# Altium footprint library ref-packages.PCBLIB: 1543 footprints (part 80 of 103) (continued)
## SQFP-S-28X28-360 [mm] (continued)
Top Overlay:
  circle w0.254: c-12.25,-12.25 r0.75
  lines w0.203: -13.67,-13.66 13.66,-13.66 13.66,13.66 -13.67,13.66 -13.67,-13.66
Mechanical 16:
  drawing of 364 lines, arcs and shapes, not listed
Mechanical 27:
  lines w0.2: -15.9,-15.9 -15.9,15.9 15.9,15.9 15.9,-15.9 -15.9,-15.9

## SQFP-S-32X32-184 [mm]
pads (184):
  rect 0.4x1.8 smd: 1(-14.625,-17) 2(-13.975,-17) 3(-13.325,-17) 4(-12.675,-17) 5(-12.025,-17) 6(-11.375,-17) 7(-10.725,-17) 8(-10.075,-17) 9(-9.425,-17) 10(-8.775,-17) 11(-8.125,-17) 12(-7.475,-17) 13(-6.825,-17) 14(-6.175,-17) 15(-5.525,-17) 16(-4.875,-17) 17(-4.225,-17) 18(-3.575,-17) 19(-2.925,-17) 20(-2.275,-17) 21(-1.625,-17) 22(-0.975,-17) 23(-0.325,-17) 24(0.325,-17) 25(0.975,-17) 26(1.625,-17) 27(2.275,-17) 28(2.925,-17) 29(3.575,-17) 30(4.225,-17) 31(4.875,-17) 32(5.525,-17) 33(6.175,-17) 34(6.825,-17) 35(7.475,-17) 36(8.125,-17) 37(8.775,-17) 38(9.425,-17) 39(10.075,-17) 40(10.725,-17) 41(11.375,-17) 42(12.025,-17) 43(12.675,-17) 44(13.325,-17) 45(13.975,-17) 46(14.625,-17) 93(14.625,17) 94(13.975,17) 95(13.325,17) 96(12.675,17) 97(12.025,17) 98(11.375,17) 99(10.725,17) 100(10.075,17) 101(9.425,17) 102(8.775,17) 103(8.125,17) 104(7.475,17) 105(6.825,17) 106(6.175,17) 107(5.525,17) 108(4.875,17) 109(4.225,17) 110(3.575,17) 111(2.925,17) 112(2.275,17) 113(1.625,17) 114(0.975,17) 115(0.325,17) 116(-0.325,17) 117(-0.975,17) 118(-1.625,17) 119(-2.275,17) 120(-2.925,17) 121(-3.575,17) 122(-4.225,17) 123(-4.875,17) 124(-5.525,17) 125(-6.175,17) 126(-6.825,17) 127(-7.475,17) 128(-8.125,17) 129(-8.775,17) 130(-9.425,17) 131(-10.075,17) 132(-10.725,17) 133(-11.375,17) 134(-12.025,17) 135(-12.675,17) 136(-13.325,17) 137(-13.975,17) 138(-14.625,17)
  rect 1.8x0.4 smd: 47(17,-14.625) 48(17,-13.975) 49(17,-13.325) 50(17,-12.675) 51(17,-12.025) 52(17,-11.375) 53(17,-10.725) 54(17,-10.075) 55(17,-9.425) 56(17,-8.775) 57(17,-8.125) 58(17,-7.475) 59(17,-6.825) 60(17,-6.175) 61(17,-5.525) 62(17,-4.875) 63(17,-4.225) 64(17,-3.575) 65(17,-2.925) 66(17,-2.275) 67(17,-1.625) 68(17,-0.975) 69(17,-0.325) 70(17,0.325) 71(17,0.975) 72(17,1.625) 73(17,2.275) 74(17,2.925) 75(17,3.575) 76(17,4.225) 77(17,4.875) 78(17,5.525) 79(17,6.175) 80(17,6.825) 81(17,7.475) 82(17,8.125) 83(17,8.775) 84(17,9.425) 85(17,10.075) 86(17,10.725) 87(17,11.375) 88(17,12.025) 89(17,12.675) 90(17,13.325) 91(17,13.975) 92(17,14.625) 139(-17,14.625) 140(-17,13.975) 141(-17,13.325) 142(-17,12.675) 143(-17,12.025) 144(-17,11.375) 145(-17,10.725) 146(-17,10.075) 147(-17,9.425) 148(-17,8.775) 149(-17,8.125) 150(-17,7.475) 151(-17,6.825) 152(-17,6.175) 153(-17,5.525) 154(-17,4.875) 155(-17,4.225) 156(-17,3.575) 157(-17,2.925) 158(-17,2.275) 159(-17,1.625) 160(-17,0.975) 161(-17,0.325) 162(-17,-0.325) 163(-17,-0.975) 164(-17,-1.625) 165(-17,-2.275) 166(-17,-2.925) 167(-17,-3.575) 168(-17,-4.225) 169(-17,-4.875) 170(-17,-5.525) 171(-17,-6.175) 172(-17,-6.825) 173(-17,-7.475) 174(-17,-8.125) 175(-17,-8.775) 176(-17,-9.425) 177(-17,-10.075) 178(-17,-10.725) 179(-17,-11.375) 180(-17,-12.025) 181(-17,-12.675) 182(-17,-13.325) 183(-17,-13.975) 184(-17,-14.625)
Top Overlay:
  circle w0.254: c-14.2,-14.2 r0.75
  lines w0.203: -15.77,-15.76 15.76,-15.76 15.76,15.76 -15.77,15.76 -15.77,-15.76
Mechanical 16:
  drawing of 188 lines, arcs and shapes, not listed
Mechanical 27:
  lines w0.2: -18.4,-18.4 -18.4,18.4 18.4,18.4 18.4,-18.4 -18.4,-18.4

## SQFP-S-32X32-240 [mil]
pads (240):
  rect 11.81x62.99 smd: 1(-580.71,-653.54) 2(-561.02,-653.54) 3(-541.34,-653.54) 4(-521.65,-653.54) 5(-501.97,-653.54) 6(-482.28,-653.54) 7(-462.6,-653.54) 8(-442.91,-653.54) 9(-423.23,-653.54) 10(-403.54,-653.54) 11(-383.86,-653.54) 12(-364.17,-653.54) 13(-344.49,-653.54) 14(-324.8,-653.54) 15(-305.12,-653.54) 16(-285.43,-653.54) 17(-265.75,-653.54) 18(-246.06,-653.54) 19(-226.38,-653.54) 20(-206.69,-653.54) 21(-187.01,-653.54) 22(-167.32,-653.54) 23(-147.64,-653.54) 24(-127.95,-653.54) 25(-108.27,-653.54) 26(-88.58,-653.54) 27(-68.9,-653.54) 28(-49.21,-653.54) 29(-29.53,-653.54) 30(-9.84,-653.54) 31(9.84,-653.54) 32(29.53,-653.54) 33(49.21,-653.54) 34(68.9,-653.54) 35(88.58,-653.54) 36(108.27,-653.54) 37(127.95,-653.54) 38(147.64,-653.54) 39(167.32,-653.54) 40(187.01,-653.54) 41(206.69,-653.54) 42(226.38,-653.54) 43(246.06,-653.54) 44(265.75,-653.54) 45(285.43,-653.54) 46(305.12,-653.54) 47(324.8,-653.54) 48(344.49,-653.54) 49(364.17,-653.54) 50(383.86,-653.54) 51(403.54,-653.54) 52(423.23,-653.54) 53(442.91,-653.54) 54(462.6,-653.54) 55(482.28,-653.54) 56(501.97,-653.54) 57(521.65,-653.54) 58(541.34,-653.54) 59(561.02,-653.54) 60(580.71,-653.54) 121(580.71,653.54) 122(561.02,653.54) 123(541.34,653.54) 124(521.65,653.54) 125(501.97,653.54) 126(482.28,653.54) 127(462.6,653.54) 128(442.91,653.54) 129(423.23,653.54) 130(403.54,653.54) 131(383.86,653.54) 132(364.17,653.54) 133(344.49,653.54) 134(324.8,653.54) 135(305.12,653.54) 136(285.43,653.54) 137(265.75,653.54) 138(246.06,653.54) 139(226.38,653.54) 140(206.69,653.54) 141(187.01,653.54) 142(167.32,653.54) 143(147.64,653.54) 144(127.95,653.54) 145(108.27,653.54) 146(88.58,653.54) 147(68.9,653.54) 148(49.21,653.54) 149(29.53,653.54) 150(9.84,653.54) 151(-9.84,653.54) 152(-29.53,653.54) 153(-49.21,653.54) 154(-68.9,653.54) 155(-88.58,653.54) 156(-108.27,653.54) 157(-127.95,653.54) 158(-147.64,653.54) 159(-167.32,653.54) 160(-187.01,653.54) 161(-206.69,653.54) 162(-226.38,653.54) 163(-246.06,653.54) 164(-265.75,653.54) 165(-285.43,653.54) 166(-305.12,653.54) 167(-324.8,653.54) 168(-344.49,653.54) 169(-364.17,653.54) 170(-383.86,653.54) 171(-403.54,653.54) 172(-423.23,653.54) 173(-442.91,653.54) 174(-462.6,653.54) 175(-482.28,653.54) 176(-501.97,653.54) 177(-521.65,653.54) 178(-541.34,653.54) 179(-561.02,653.54) 180(-580.71,653.54)
  rect 62.99x11.81 smd: 61(653.54,-580.71) 62(653.54,-561.02) 63(653.54,-541.34) 64(653.54,-521.65) 65(653.54,-501.97) 66(653.54,-482.28) 67(653.54,-462.6) 68(653.54,-442.91) 69(653.54,-423.23) 70(653.54,-403.54) 71(653.54,-383.86) 72(653.54,-364.17) 73(653.54,-344.49) 74(653.54,-324.8) 75(653.54,-305.12) 76(653.54,-285.43) 77(653.54,-265.75) 78(653.54,-246.06) 79(653.54,-226.38) 80(653.54,-206.69) 81(653.54,-187.01) 82(653.54,-167.32) 83(653.54,-147.64) 84(653.54,-127.95) 85(653.54,-108.27) 86(653.54,-88.58) 87(653.54,-68.9) 88(653.54,-49.21) 89(653.54,-29.53) 90(653.54,-9.84) 91(653.54,9.84) 92(653.54,29.53) 93(653.54,49.21) 94(653.54,68.9) 95(653.54,88.58) 96(653.54,108.27) 97(653.54,127.95) 98(653.54,147.64) 99(653.54,167.32) 100(653.54,187.01) 101(653.54,206.69) 102(653.54,226.38) 103(653.54,246.06) 104(653.54,265.75) 105(653.54,285.43) 106(653.54,305.12) 107(653.54,324.8) 108(653.54,344.49) 109(653.54,364.17) 110(653.54,383.86) 111(653.54,403.54) 112(653.54,423.23) 113(653.54,442.91) 114(653.54,462.6) 115(653.54,482.28) 116(653.54,501.97) 117(653.54,521.65) 118(653.54,541.34) 119(653.54,561.02) 120(653.54,580.71) 181(-653.54,580.71) 182(-653.54,561.02) 183(-653.54,541.34) 184(-653.54,521.65) 185(-653.54,501.97) 186(-653.54,482.28) 187(-653.54,462.6) 188(-653.54,442.91) 189(-653.54,423.23) 190(-653.54,403.54) 191(-653.54,383.86) 192(-653.54,364.17) 193(-653.54,344.49) 194(-653.54,324.8) 195(-653.54,305.12) 196(-653.54,285.43) 197(-653.54,265.75) 198(-653.54,246.06) 199(-653.54,226.38) 200(-653.54,206.69) 201(-653.54,187.01) 202(-653.54,167.32) 203(-653.54,147.64) 204(-653.54,127.95) 205(-653.54,108.27) 206(-653.54,88.58) 207(-653.54,68.9) 208(-653.54,49.21) 209(-653.54,29.53) 210(-653.54,9.84) 211(-653.54,-9.84) 212(-653.54,-29.53) 213(-653.54,-49.21) 214(-653.54,-68.9) 215(-653.54,-88.58) 216(-653.54,-108.27) 217(-653.54,-127.95) 218(-653.54,-147.64) 219(-653.54,-167.32) 220(-653.54,-187.01) 221(-653.54,-206.69) 222(-653.54,-226.38) 223(-653.54,-246.06) 224(-653.54,-265.75) 225(-653.54,-285.43) 226(-653.54,-305.12) 227(-653.54,-324.8) 228(-653.54,-344.49) 229(-653.54,-364.17) 230(-653.54,-383.86) 231(-653.54,-403.54) 232(-653.54,-423.23) 233(-653.54,-442.91) 234(-653.54,-462.6) 235(-653.54,-482.28) 236(-653.54,-501.97) 237(-653.54,-521.65) 238(-653.54,-541.34) 239(-653.54,-561.02) 240(-653.54,-580.71)
Top Overlay:
  circle w10: c-559.06,-559.06 r29.53
  lines w8: -620.87,-620.47 620.47,-620.47 620.47,620.47 -620.87,620.47 -620.87,-620.47
Mechanical 16:
  drawing of 244 lines, arcs and shapes, not listed
Mechanical 27:
  lines w7.87: -704.72,-704.72 -704.72,704.72 724.41,704.72 724.41,-704.72 -704.72,-704.72

## SQFP-S-32X32-248 [mil]
pads (248):
  rect 11.81x62.99 smd: 1(-600.39,-653.54) 2(-580.71,-653.54) 3(-561.02,-653.54) 4(-541.34,-653.54) 5(-521.65,-653.54) 6(-501.97,-653.54) 7(-482.28,-653.54) 8(-462.6,-653.54) 9(-442.91,-653.54) 10(-423.23,-653.54) 11(-403.54,-653.54) 12(-383.86,-653.54) 13(-364.17,-653.54) 14(-344.49,-653.54) 15(-324.8,-653.54) 16(-305.12,-653.54) 17(-285.43,-653.54) 18(-265.75,-653.54) 19(-246.06,-653.54) 20(-226.38,-653.54) 21(-206.69,-653.54) 22(-187.01,-653.54) 23(-167.32,-653.54) 24(-147.64,-653.54) 25(-127.95,-653.54) 26(-108.27,-653.54) 27(-88.58,-653.54) 28(-68.9,-653.54) 29(-49.21,-653.54) 30(-29.53,-653.54) 31(-9.84,-653.54) 32(9.84,-653.54) 33(29.53,-653.54) 34(49.21,-653.54) 35(68.9,-653.54) 36(88.58,-653.54) 37(108.27,-653.54) 38(127.95,-653.54) 39(147.64,-653.54) 40(167.32,-653.54) 41(187.01,-653.54) 42(206.69,-653.54) 43(226.38,-653.54) 44(246.06,-653.54) 45(265.75,-653.54) 46(285.43,-653.54) 47(305.12,-653.54) 48(324.8,-653.54) 49(344.49,-653.54) 50(364.17,-653.54) 51(383.86,-653.54) 52(403.54,-653.54) 53(423.23,-653.54) 54(442.91,-653.54) 55(462.6,-653.54) 56(482.28,-653.54) 57(501.97,-653.54) 58(521.65,-653.54) 59(541.34,-653.54) 60(561.02,-653.54) 61(580.71,-653.54) 62(600.39,-653.54) 125(600.39,653.54) 126(580.71,653.54) 127(561.02,653.54) 128(541.34,653.54) 129(521.65,653.54) 130(501.97,653.54) 131(482.28,653.54) 132(462.6,653.54) 133(442.91,653.54) 134(423.23,653.54) 135(403.54,653.54) 136(383.86,653.54) 137(364.17,653.54) 138(344.49,653.54) 139(324.8,653.54) 140(305.12,653.54) 141(285.43,653.54) 142(265.75,653.54) 143(246.06,653.54) 144(226.38,653.54) 145(206.69,653.54) 146(187.01,653.54) 147(167.32,653.54) 148(147.64,653.54) 149(127.95,653.54) 150(108.27,653.54) 151(88.58,653.54) 152(68.9,653.54) 153(49.21,653.54) 154(29.53,653.54) 155(9.84,653.54) 156(-9.84,653.54) 157(-29.53,653.54) 158(-49.21,653.54) 159(-68.9,653.54) 160(-88.58,653.54) 161(-108.27,653.54) 162(-127.95,653.54) 163(-147.64,653.54) 164(-167.32,653.54) 165(-187.01,653.54) 166(-206.69,653.54) 167(-226.38,653.54) 168(-246.06,653.54) 169(-265.75,653.54) 170(-285.43,653.54) 171(-305.12,653.54) 172(-324.8,653.54) 173(-344.49,653.54) 174(-364.17,653.54) 175(-383.86,653.54) 176(-403.54,653.54) 177(-423.23,653.54) 178(-442.91,653.54) 179(-462.6,653.54) 180(-482.28,653.54) 181(-501.97,653.54) 182(-521.65,653.54) 183(-541.34,653.54) 184(-561.02,653.54) 185(-580.71,653.54) 186(-600.39,653.54)
  rect 62.99x11.81 smd: 63(653.54,-600.39) 64(653.54,-580.71) 65(653.54,-561.02) 66(653.54,-541.34) 67(653.54,-521.65) 68(653.54,-501.97) 69(653.54,-482.28) 70(653.54,-462.6) 71(653.54,-442.91) 72(653.54,-423.23) 73(653.54,-403.54) 74(653.54,-383.86) 75(653.54,-364.17) 76(653.54,-344.49) 77(653.54,-324.8) 78(653.54,-305.12) 79(653.54,-285.43) 80(653.54,-265.75) 81(653.54,-246.06) 82(653.54,-226.38) 83(653.54,-206.69) 84(653.54,-187.01) 85(653.54,-167.32) 86(653.54,-147.64) 87(653.54,-127.95) 88(653.54,-108.27) 89(653.54,-88.58) 90(653.54,-68.9) 91(653.54,-49.21) 92(653.54,-29.53) 93(653.54,-9.84) 94(653.54,9.84) 95(653.54,29.53) 96(653.54,49.21) 97(653.54,68.9) 98(653.54,88.58) 99(653.54,108.27) 100(653.54,127.95) 101(653.54,147.64) 102(653.54,167.32) 103(653.54,187.01) 104(653.54,206.69) 105(653.54,226.38) 106(653.54,246.06) 107(653.54,265.75) 108(653.54,285.43) 109(653.54,305.12) 110(653.54,324.8) 111(653.54,344.49) 112(653.54,364.17) 113(653.54,383.86) 114(653.54,403.54) 115(653.54,423.23) 116(653.54,442.91) 117(653.54,462.6) 118(653.54,482.28) 119(653.54,501.97) 120(653.54,521.65) 121(653.54,541.34) 122(653.54,561.02) 123(653.54,580.71) 124(653.54,600.39) 187(-653.54,600.39) 188(-653.54,580.71) 189(-653.54,561.02) 190(-653.54,541.34) 191(-653.54,521.65) 192(-653.54,501.97) 193(-653.54,482.28) 194(-653.54,462.6) 195(-653.54,442.91) 196(-653.54,423.23) 197(-653.54,403.54) 198(-653.54,383.86) 199(-653.54,364.17) 200(-653.54,344.49) 201(-653.54,324.8) 202(-653.54,305.12) 203(-653.54,285.43) 204(-653.54,265.75) 205(-653.54,246.06) 206(-653.54,226.38) 207(-653.54,206.69) 208(-653.54,187.01) 209(-653.54,167.32) 210(-653.54,147.64) 211(-653.54,127.95) 212(-653.54,108.27) 213(-653.54,88.58) 214(-653.54,68.9) 215(-653.54,49.21) 216(-653.54,29.53) 217(-653.54,9.84) 218(-653.54,-9.84) 219(-653.54,-29.53) 220(-653.54,-49.21) 221(-653.54,-68.9) 222(-653.54,-88.58) 223(-653.54,-108.27) 224(-653.54,-127.95) 225(-653.54,-147.64) 226(-653.54,-167.32) 227(-653.54,-187.01) 228(-653.54,-206.69) 229(-653.54,-226.38) 230(-653.54,-246.06) 231(-653.54,-265.75) 232(-653.54,-285.43) 233(-653.54,-305.12) 234(-653.54,-324.8) 235(-653.54,-344.49) 236(-653.54,-364.17) 237(-653.54,-383.86) 238(-653.54,-403.54) 239(-653.54,-423.23) 240(-653.54,-442.91) 241(-653.54,-462.6) 242(-653.54,-482.28) 243(-653.54,-501.97) 244(-653.54,-521.65) 245(-653.54,-541.34) 246(-653.54,-561.02) 247(-653.54,-580.71) 248(-653.54,-600.39)
Top Overlay:
  circle w10: c-559.06,-559.06 r29.53
  lines w8: -620.87,-620.47 620.47,-620.47 620.47,620.47 -620.87,620.47 -620.87,-620.47
Mechanical 16:
  drawing of 252 lines, arcs and shapes, not listed
Mechanical 27:
  lines w7.87: -704.72,-704.72 -704.72,704.72 724.41,704.72 724.41,-704.72 -704.72,-704.72

## SQFP-S-32X32-304 [mm]
pads (304):
  rect 0.25x1.6 smd: 1(-15,-16.6) 2(-14.6,-16.6) 3(-14.2,-16.6) 4(-13.8,-16.6) 5(-13.4,-16.6) 6(-13,-16.6) 7(-12.6,-16.6) 8(-12.2,-16.6) 9(-11.8,-16.6) 10(-11.4,-16.6) 11(-11,-16.6) 12(-10.6,-16.6) 13(-10.2,-16.6) 14(-9.8,-16.6) 15(-9.4,-16.6) 16(-9,-16.6) 17(-8.6,-16.6) 18(-8.2,-16.6) 19(-7.8,-16.6) 20(-7.4,-16.6) 21(-7,-16.6) 22(-6.6,-16.6) 23(-6.2,-16.6) 24(-5.8,-16.6) 25(-5.4,-16.6) 26(-5,-16.6) 27(-4.6,-16.6) 28(-4.2,-16.6) 29(-3.8,-16.6) 30(-3.4,-16.6) 31(-3,-16.6) 32(-2.6,-16.6) 33(-2.2,-16.6) 34(-1.8,-16.6) 35(-1.4,-16.6) 36(-1,-16.6) 37(-0.6,-16.6) 38(-0.2,-16.6) 39(0.2,-16.6) 40(0.6,-16.6) 41(1,-16.6) 42(1.4,-16.6) 43(1.8,-16.6) 44(2.2,-16.6) 45(2.6,-16.6) 46(3,-16.6) 47(3.4,-16.6) 48(3.8,-16.6) 49(4.2,-16.6) 50(4.6,-16.6) 51(5,-16.6) 52(5.4,-16.6) 53(5.8,-16.6) 54(6.2,-16.6) 55(6.6,-16.6) 56(7,-16.6) 57(7.4,-16.6) 58(7.8,-16.6) 59(8.2,-16.6) 60(8.6,-16.6) 61(9,-16.6) 62(9.4,-16.6) 63(9.8,-16.6) 64(10.2,-16.6) 65(10.6,-16.6) 66(11,-16.6) 67(11.4,-16.6) 68(11.8,-16.6) 69(12.2,-16.6) 70(12.6,-16.6) 71(13,-16.6) 72(13.4,-16.6) 73(13.8,-16.6) 74(14.2,-16.6) 75(14.6,-16.6) 76(15,-16.6) 153(15,16.6) 154(14.6,16.6) 155(14.2,16.6) 156(13.8,16.6) 157(13.4,16.6) 158(13,16.6) 159(12.6,16.6) 160(12.2,16.6) 161(11.8,16.6) 162(11.4,16.6) 163(11,16.6) 164(10.6,16.6) 165(10.2,16.6) 166(9.8,16.6) 167(9.4,16.6) 168(9,16.6) 169(8.6,16.6) 170(8.2,16.6) 171(7.8,16.6) 172(7.4,16.6) 173(7,16.6) 174(6.6,16.6) 175(6.2,16.6) 176(5.8,16.6) 177(5.4,16.6) 178(5,16.6) 179(4.6,16.6) 180(4.2,16.6) 181(3.8,16.6) 182(3.4,16.6) 183(3,16.6) 184(2.6,16.6) 185(2.2,16.6) 186(1.8,16.6) 187(1.4,16.6) 188(1,16.6) 189(0.6,16.6) 190(0.2,16.6) 191(-0.2,16.6) 192(-0.6,16.6) 193(-1,16.6) 194(-1.4,16.6) 195(-1.8,16.6) 196(-2.2,16.6) 197(-2.6,16.6) 198(-3,16.6) 199(-3.4,16.6) 200(-3.8,16.6) 201(-4.2,16.6) 202(-4.6,16.6) 203(-5,16.6) 204(-5.4,16.6) 205(-5.8,16.6) 206(-6.2,16.6) 207(-6.6,16.6) 208(-7,16.6) 209(-7.4,16.6) 210(-7.8,16.6) 211(-8.2,16.6) 212(-8.6,16.6) 213(-9,16.6) 214(-9.4,16.6) 215(-9.8,16.6) 216(-10.2,16.6) 217(-10.6,16.6) 218(-11,16.6) 219(-11.4,16.6) 220(-11.8,16.6) 221(-12.2,16.6) 222(-12.6,16.6) 223(-13,16.6) 224(-13.4,16.6) 225(-13.8,16.6) 226(-14.2,16.6) 227(-14.6,16.6) 228(-15,16.6)
  rect 1.6x0.25 smd: 77(16.6,-15) 78(16.6,-14.6) 79(16.6,-14.2) 80(16.6,-13.8) 81(16.6,-13.4) 82(16.6,-13) 83(16.6,-12.6) 84(16.6,-12.2) 85(16.6,-11.8) 86(16.6,-11.4) 87(16.6,-11) 88(16.6,-10.6) 89(16.6,-10.2) 90(16.6,-9.8) 91(16.6,-9.4) 92(16.6,-9) 93(16.6,-8.6) 94(16.6,-8.2) 95(16.6,-7.8) 96(16.6,-7.4) 97(16.6,-7) 98(16.6,-6.6) 99(16.6,-6.2) 100(16.6,-5.8) 101(16.6,-5.4) 102(16.6,-5) 103(16.6,-4.6) 104(16.6,-4.2) 105(16.6,-3.8) 106(16.6,-3.4) 107(16.6,-3) 108(16.6,-2.6) 109(16.6,-2.2) 110(16.6,-1.8) 111(16.6,-1.4) 112(16.6,-1) 113(16.6,-0.6) 114(16.6,-0.2) 115(16.6,0.2) 116(16.6,0.6) 117(16.6,1) 118(16.6,1.4) 119(16.6,1.8) 120(16.6,2.2) 121(16.6,2.6) 122(16.6,3) 123(16.6,3.4) 124(16.6,3.8) 125(16.6,4.2) 126(16.6,4.6) 127(16.6,5) 128(16.6,5.4) 129(16.6,5.8) 130(16.6,6.2) 131(16.6,6.6) 132(16.6,7) 133(16.6,7.4) 134(16.6,7.8) 135(16.6,8.2) 136(16.6,8.6) 137(16.6,9) 138(16.6,9.4) 139(16.6,9.8) 140(16.6,10.2) 141(16.6,10.6) 142(16.6,11) 143(16.6,11.4) 144(16.6,11.8) 145(16.6,12.2) 146(16.6,12.6) 147(16.6,13) 148(16.6,13.4) 149(16.6,13.8) 150(16.6,14.2) 151(16.6,14.6) 152(16.6,15) 229(-16.6,15) 230(-16.6,14.6) 231(-16.6,14.2) 232(-16.6,13.8) 233(-16.6,13.4) 234(-16.6,13) 235(-16.6,12.6) 236(-16.6,12.2) 237(-16.6,11.8) 238(-16.6,11.4) 239(-16.6,11) 240(-16.6,10.6) 241(-16.6,10.2) 242(-16.6,9.8) 243(-16.6,9.4) 244(-16.6,9) 245(-16.6,8.6) 246(-16.6,8.2) 247(-16.6,7.8) 248(-16.6,7.4) 249(-16.6,7) 250(-16.6,6.6) 251(-16.6,6.2) 252(-16.6,5.8) 253(-16.6,5.4) 254(-16.6,5) 255(-16.6,4.6) 256(-16.6,4.2) 257(-16.6,3.8) 258(-16.6,3.4) 259(-16.6,3) 260(-16.6,2.6) 261(-16.6,2.2) 262(-16.6,1.8) 263(-16.6,1.4) 264(-16.6,1) 265(-16.6,0.6) 266(-16.6,0.2) 267(-16.6,-0.2) 268(-16.6,-0.6) 269(-16.6,-1) 270(-16.6,-1.4) 271(-16.6,-1.8) 272(-16.6,-2.2) 273(-16.6,-2.6) 274(-16.6,-3) 275(-16.6,-3.4) 276(-16.6,-3.8) 277(-16.6,-4.2) 278(-16.6,-4.6) 279(-16.6,-5) 280(-16.6,-5.4) 281(-16.6,-5.8) 282(-16.6,-6.2) 283(-16.6,-6.6) 284(-16.6,-7) 285(-16.6,-7.4) 286(-16.6,-7.8) 287(-16.6,-8.2) 288(-16.6,-8.6) 289(-16.6,-9) 290(-16.6,-9.4) 291(-16.6,-9.8) 292(-16.6,-10.2) 293(-16.6,-10.6) 294(-16.6,-11) 295(-16.6,-11.4) 296(-16.6,-11.8) 297(-16.6,-12.2) 298(-16.6,-12.6) 299(-16.6,-13) 300(-16.6,-13.4) 301(-16.6,-13.8) 302(-16.6,-14.2) 303(-16.6,-14.6) 304(-16.6,-15)
Top Overlay:
  circle w0.254: c-14.2,-14.2 r0.75
  lines w0.203: -15.77,-15.76 15.76,-15.76 15.76,15.76 -15.77,15.76 -15.77,-15.76
Mechanical 16:
  drawing of 308 lines, arcs and shapes, not listed
Mechanical 27:
  lines w0.2: -17.9,-17.9 -17.9,17.9 18.4,17.9 18.4,-17.9 -17.9,-17.9

## SQFP-S-32X32-312 [mm]
pads (312):
  rect 0.25x1.6 smd: 1(-15.4,-16.6) 2(-15,-16.6) 3(-14.6,-16.6) 4(-14.2,-16.6) 5(-13.8,-16.6) 6(-13.4,-16.6) 7(-13,-16.6) 8(-12.6,-16.6) 9(-12.2,-16.6) 10(-11.8,-16.6) 11(-11.4,-16.6) 12(-11,-16.6) 13(-10.6,-16.6) 14(-10.2,-16.6) 15(-9.8,-16.6) 16(-9.4,-16.6) 17(-9,-16.6) 18(-8.6,-16.6) 19(-8.2,-16.6) 20(-7.8,-16.6) 21(-7.4,-16.6) 22(-7,-16.6) 23(-6.6,-16.6) 24(-6.2,-16.6) 25(-5.8,-16.6) 26(-5.4,-16.6) 27(-5,-16.6) 28(-4.6,-16.6) 29(-4.2,-16.6) 30(-3.8,-16.6) 31(-3.4,-16.6) 32(-3,-16.6) 33(-2.6,-16.6) 34(-2.2,-16.6) 35(-1.8,-16.6) 36(-1.4,-16.6) 37(-1,-16.6) 38(-0.6,-16.6) 39(-0.2,-16.6) 40(0.2,-16.6) 41(0.6,-16.6) 42(1,-16.6) 43(1.4,-16.6) 44(1.8,-16.6) 45(2.2,-16.6) 46(2.6,-16.6) 47(3,-16.6) 48(3.4,-16.6) 49(3.8,-16.6) 50(4.2,-16.6) 51(4.6,-16.6) 52(5,-16.6) 53(5.4,-16.6) 54(5.8,-16.6) 55(6.2,-16.6) 56(6.6,-16.6) 57(7,-16.6) 58(7.4,-16.6) 59(7.8,-16.6) 60(8.2,-16.6) 61(8.6,-16.6) 62(9,-16.6) 63(9.4,-16.6) 64(9.8,-16.6) 65(10.2,-16.6) 66(10.6,-16.6) 67(11,-16.6) 68(11.4,-16.6) 69(11.8,-16.6) 70(12.2,-16.6) 71(12.6,-16.6) 72(13,-16.6) 73(13.4,-16.6) 74(13.8,-16.6) 75(14.2,-16.6) 76(14.6,-16.6) 77(15,-16.6) 78(15.4,-16.6) 157(15.4,16.6) 158(15,16.6) 159(14.6,16.6) 160(14.2,16.6) 161(13.8,16.6) 162(13.4,16.6) 163(13,16.6) 164(12.6,16.6) 165(12.2,16.6) 166(11.8,16.6) 167(11.4,16.6) 168(11,16.6) 169(10.6,16.6) 170(10.2,16.6) 171(9.8,16.6) 172(9.4,16.6) 173(9,16.6) 174(8.6,16.6) 175(8.2,16.6) 176(7.8,16.6) 177(7.4,16.6) 178(7,16.6) 179(6.6,16.6) 180(6.2,16.6) 181(5.8,16.6) 182(5.4,16.6) 183(5,16.6) 184(4.6,16.6) 185(4.2,16.6) 186(3.8,16.6) 187(3.4,16.6) 188(3,16.6) 189(2.6,16.6) 190(2.2,16.6) 191(1.8,16.6) 192(1.4,16.6) 193(1,16.6) 194(0.6,16.6) 195(0.2,16.6) 196(-0.2,16.6) 197(-0.6,16.6) 198(-1,16.6) 199(-1.4,16.6) 200(-1.8,16.6) 201(-2.2,16.6) 202(-2.6,16.6) 203(-3,16.6) 204(-3.4,16.6) 205(-3.8,16.6) 206(-4.2,16.6) 207(-4.6,16.6) 208(-5,16.6) 209(-5.4,16.6) 210(-5.8,16.6) 211(-6.2,16.6) 212(-6.6,16.6) 213(-7,16.6) 214(-7.4,16.6) 215(-7.8,16.6) 216(-8.2,16.6) 217(-8.6,16.6) 218(-9,16.6) 219(-9.4,16.6) 220(-9.8,16.6) 221(-10.2,16.6) 222(-10.6,16.6) 223(-11,16.6) 224(-11.4,16.6) 225(-11.8,16.6) 226(-12.2,16.6) 227(-12.6,16.6) 228(-13,16.6) 229(-13.4,16.6) 230(-13.8,16.6) 231(-14.2,16.6) 232(-14.6,16.6) 233(-15,16.6) 234(-15.4,16.6)
  rect 1.6x0.25 smd: 79(16.6,-15.4) 80(16.6,-15) 81(16.6,-14.6) 82(16.6,-14.2) 83(16.6,-13.8) 84(16.6,-13.4) 85(16.6,-13) 86(16.6,-12.6) 87(16.6,-12.2) 88(16.6,-11.8) 89(16.6,-11.4) 90(16.6,-11) 91(16.6,-10.6) 92(16.6,-10.2) 93(16.6,-9.8) 94(16.6,-9.4) 95(16.6,-9) 96(16.6,-8.6) 97(16.6,-8.2) 98(16.6,-7.8) 99(16.6,-7.4) 100(16.6,-7) 101(16.6,-6.6) 102(16.6,-6.2) 103(16.6,-5.8) 104(16.6,-5.4) 105(16.6,-5) 106(16.6,-4.6) 107(16.6,-4.2) 108(16.6,-3.8) 109(16.6,-3.4) 110(16.6,-3) 111(16.6,-2.6) 112(16.6,-2.2) 113(16.6,-1.8) 114(16.6,-1.4) 115(16.6,-1) 116(16.6,-0.6) 117(16.6,-0.2) 118(16.6,0.2) 119(16.6,0.6) 120(16.6,1) 121(16.6,1.4) 122(16.6,1.8) 123(16.6,2.2) 124(16.6,2.6) 125(16.6,3) 126(16.6,3.4) 127(16.6,3.8) 128(16.6,4.2) 129(16.6,4.6) 130(16.6,5) 131(16.6,5.4) 132(16.6,5.8) 133(16.6,6.2) 134(16.6,6.6) 135(16.6,7) 136(16.6,7.4) 137(16.6,7.8) 138(16.6,8.2) 139(16.6,8.6) 140(16.6,9) 141(16.6,9.4) 142(16.6,9.8) 143(16.6,10.2) 144(16.6,10.6) 145(16.6,11) 146(16.6,11.4) 147(16.6,11.8) 148(16.6,12.2) 149(16.6,12.6) 150(16.6,13) 151(16.6,13.4) 152(16.6,13.8) 153(16.6,14.2) 154(16.6,14.6) 155(16.6,15) 156(16.6,15.4) 235(-16.6,15.4) 236(-16.6,15) 237(-16.6,14.6) 238(-16.6,14.2) 239(-16.6,13.8) 240(-16.6,13.4) 241(-16.6,13) 242(-16.6,12.6) 243(-16.6,12.2) 244(-16.6,11.8) 245(-16.6,11.4) 246(-16.6,11) 247(-16.6,10.6) 248(-16.6,10.2) 249(-16.6,9.8) 250(-16.6,9.4) 251(-16.6,9) 252(-16.6,8.6) 253(-16.6,8.2) 254(-16.6,7.8) 255(-16.6,7.4) 256(-16.6,7) 257(-16.6,6.6) 258(-16.6,6.2) 259(-16.6,5.8) 260(-16.6,5.4) 261(-16.6,5) 262(-16.6,4.6) 263(-16.6,4.2) 264(-16.6,3.8) 265(-16.6,3.4) 266(-16.6,3) 267(-16.6,2.6) 268(-16.6,2.2) 269(-16.6,1.8) 270(-16.6,1.4) 271(-16.6,1) 272(-16.6,0.6) 273(-16.6,0.2) 274(-16.6,-0.2) 275(-16.6,-0.6) 276(-16.6,-1) 277(-16.6,-1.4) 278(-16.6,-1.8) 279(-16.6,-2.2) 280(-16.6,-2.6) 281(-16.6,-3) 282(-16.6,-3.4) 283(-16.6,-3.8) 284(-16.6,-4.2) 285(-16.6,-4.6) 286(-16.6,-5) 287(-16.6,-5.4) 288(-16.6,-5.8) 289(-16.6,-6.2) 290(-16.6,-6.6) 291(-16.6,-7) 292(-16.6,-7.4) 293(-16.6,-7.8) 294(-16.6,-8.2) 295(-16.6,-8.6) 296(-16.6,-9) 297(-16.6,-9.4) 298(-16.6,-9.8) 299(-16.6,-10.2) 300(-16.6,-10.6) 301(-16.6,-11) 302(-16.6,-11.4) 303(-16.6,-11.8) 304(-16.6,-12.2) 305(-16.6,-12.6) 306(-16.6,-13) 307(-16.6,-13.4) 308(-16.6,-13.8) 309(-16.6,-14.2) 310(-16.6,-14.6) 311(-16.6,-15) 312(-16.6,-15.4)
Top Overlay:
  circle w0.254: c-14.2,-14.2 r0.75
  lines w0.203: -15.77,-15.76 15.76,-15.76 15.76,15.76 -15.77,15.76 -15.77,-15.76
Mechanical 16:
  drawing of 316 lines, arcs and shapes, not listed
Mechanical 27:
  lines w0.2: -17.9,-17.9 -17.9,17.9 18.4,17.9 18.4,-17.9 -17.9,-17.9